# Altium footprint library IDETEC.PcbLib: 275 footprints (part 13 of 18)
Each footprint in its own frame and in the unit in brackets; x right, y up, seen from the top. Pads: shape width x height; smd on the part's side, far side on the other; paste and mask are expansions set on the pad; w line width, h text height; cw(c..) or ccw(c..) is an arc to the next point about the centre after c.
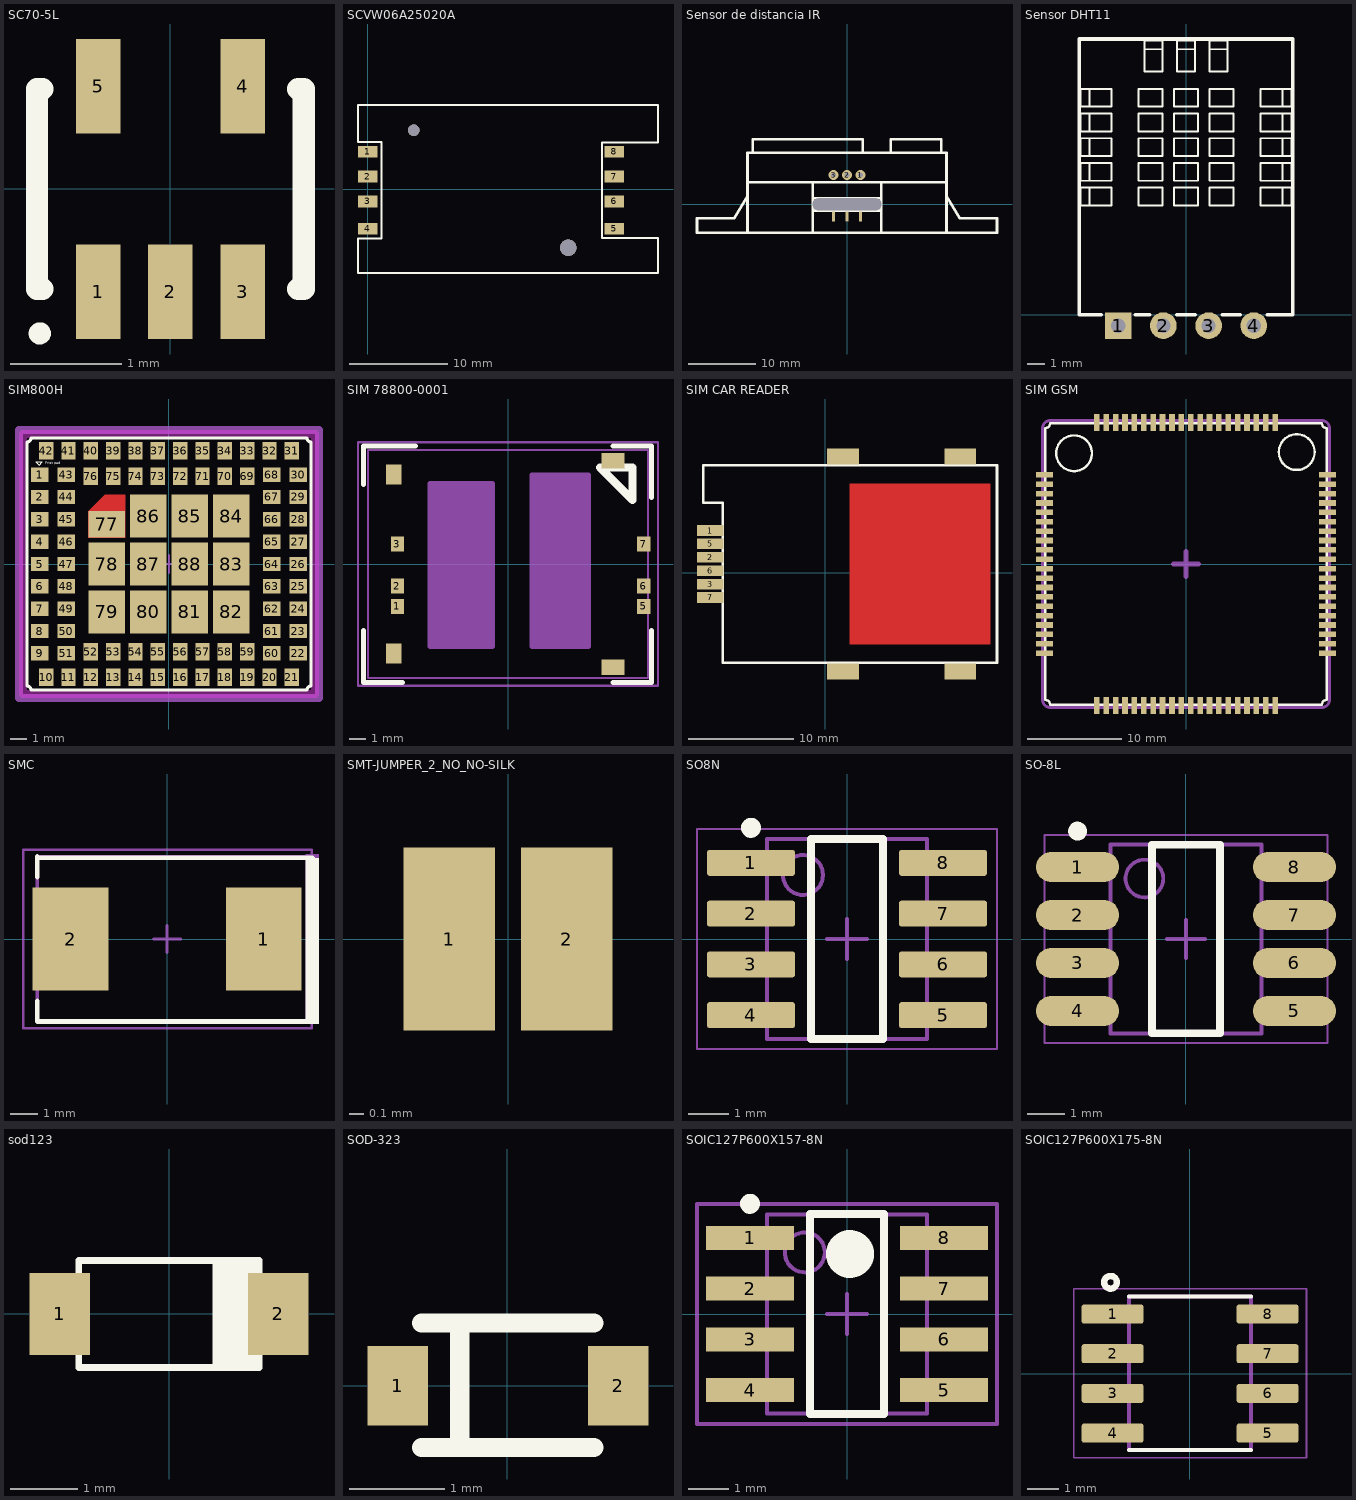
[diagram p12: the footprints below, top view; thin cyan lines are the x and y axes]

## SC70-5L [mm] "SOT-23/SC-74A; 5 Leads; Body 3.1 x 3.1 mm, inc. leads (LxW max)"
height 1.45
pads (5):
  rect 0.4x0.85 smd: 1(-0.65,-0.925) 2(0,-0.925) 3(0.65,-0.925) 4(0.65,0.923) 5(-0.65,0.925)
Top Overlay:
  circle w0.1: c-1.175,-1.3 r0.05
  lines w0.2: -1.15,-0.9 -1.2,-0.9 -1.2,0.9 -1.15,0.9 ; 1.15,-0.9 1.2,-0.9 1.2,0.9 1.15,0.9
3D body "User Library-SC70-5-1.STEP": height 0.95, standoff 0, extent -1,-1.05 1,1.05

## SCVW06A25020A [mm] "SIM CARD BLOCK TYPE, HINGED COVER"
height 2.5
pads (8):
  rect 2x1.2 smd: 1(0,3.81) 2(0,1.27) 3(0,-1.27) 4(0,-4.064) 5(25.22,-4.064) 6(25.22,-1.27) 7(25.22,1.27) 8(25.22,3.81)
via 20.51,-6 diameter 1.7 hole 1.7
via 4.71,6 diameter 1.2 hole 1.2
Top Overlay:
  lines w0.2: -0.99,-8.6 -0.21,-8.6 29.7,-8.6 29.7,-5.025 23.95,-5.025 23.95,-0.95 23.95,1.41 23.95,4.76 29.7,4.76 29.7,8.6 -0.99,8.6 -0.99,4.79 1.418,4.79 1.418,2.003 1.418,-2.228 1.418,-5.075 -0.99,-5.075 -0.99,-5.851 -0.99,-7.82 -0.99,-8.6
3D body "SIMLOCK-1.STEP": height 2.5, standoff 0, extent -0.66,-8.73 29.34,8.57

## Sensor de distancia IR [mm] "sensor de distancia"
height 12
pads (7):
  round 1.5 hole 0.8: 1(2,4.35) 2(0,4.35) 3(-2,4.35)
  rect 0.5x1.5 smd: ""(-2,-1.78) ""(0,-1.78) ""(2,-1.78)
  round 0 hole 1.8 slot 10.2 at 0 deg unplated: ""(0,0)
Top Overlay:
  lines w0.4: -14.75,3.3 14.75,3.3 ; -14.75,5 -14.75,7.665 ; -13.975,7.665 -13.975,9.66 2.325,9.66 2.325,7.66 ; -5.1,-4.2 -5.1,-0.9 ; -5.1,3.3 -5.1,0.9 ; 5.1,-4.2 5.1,-0.9 ; 5.1,3.3 5.1,0.9 ; 6.475,7.66 6.475,9.66 13.975,9.66 13.975,7.665 ; -14.75,-4.2 14.75,-4.2 ; -14.75,-4.2 -14.75,7.665 ; -14.75,-4.2 -18.5,-4.2 -22.25,-4.2 -22.25,-2.05 -16.75,-2.05 -14.75,1.3 -14.75,-4.2 ; -14.75,7.665 14.75,7.665 14.75,-4.2 ; -5.1,-0.9 5.1,-0.9 ; -5.1,-0.9 -5.1,0.9 ; -5.1,0.9 5.1,0.9 ; 5.1,-0.9 5.1,0.9 ; 14.75,-4.2 18.5,-4.2 22.25,-4.2 22.25,-2.05 16.75,-2.05 14.75,1.3 14.75,-4.2
3D body "User Library-sharp.STEP": height 13.04, standoff -5.96, extent -22.24,-4.17 22.26,9.73

## Sensor DHT11 [mm] "sensor de humeada y temperarura"
height 12
pads (4):
  rect 1.5x1.5 hole 0.8: 1(-3.81,-0.6)
  round 1.5 hole 0.8: 2(-1.27,-0.6) 3(1.27,-0.6) 4(3.81,-0.6)
Top Overlay:
  lines w0.11: -5.425,6.15 -5.425,7.15 ; -5.425,7.537 -5.425,8.537 ; -5.425,8.935 -5.425,9.925 ; -5.425,10.312 -5.425,11.31 ; -5.425,11.7 -5.425,12.7 -5.925,12.7 ; -2.331,14.925 -1.331,14.925 ; -0.5,13.675 -0.5,15.425 0.5,15.425 ; -0.5,14.925 0.506,14.925 ; -0.494,13.675 0.506,13.675 0.506,15.425 ; 1.341,14.925 2.331,14.925 2.331,15.425 ; 5.425,6.15 5.425,7.15 ; 5.425,7.537 5.425,8.537 ; 5.425,8.935 5.425,9.925 ; 5.425,10.312 5.425,11.31 ; 5.425,11.7 5.425,12.7 5.925,12.7 ; -5.925,12.7 -4.175,12.7 -4.175,11.7 -5.925,11.7 -5.925,12.7 ; 2.331,15.425 1.331,15.425 1.331,13.675 2.331,13.675 2.331,15.425 ; 5.925,12.7 5.925,11.7 4.175,11.7 4.175,12.7 5.925,12.7 ; -5.925,6.15 -5.925,7.15 -4.175,7.15 -4.175,6.15 -5.925,6.15 ; -5.925,7.537 -5.925,8.537 -4.175,8.537 -4.175,7.537 -5.925,7.537 ; -5.925,8.925 -5.925,9.925 -5.487,9.925 -4.613,9.925 -4.175,9.925 -4.175,8.925 -5.925,8.925 ; -5.925,10.312 -5.925,11.312 -4.175,11.312 -4.175,10.312 -5.925,10.312 ; -2.68,6.15 -2.68,7.15 -1.33,7.15 -1.33,6.15 -2.68,6.15 ; -2.68,7.537 -2.68,8.537 -1.33,8.537 -1.33,7.537 -2.68,7.537 ; -2.68,8.925 -2.68,9.925 -1.33,9.925 -1.33,8.925 -2.68,8.925 ; -2.68,10.312 -2.68,11.312 -1.33,11.312 -1.33,10.312 -2.68,10.312 ; -2.68,11.7 -1.33,11.7 -1.33,12.7 -2.68,12.7 -2.68,11.7 ; -2.331,13.675 -2.331,15.425 -1.331,15.425 -1.331,13.675 -2.331,13.675 ; -0.675,6.15 -0.675,7.15 0.675,7.15 0.675,6.15 -0.675,6.15 ; -0.675,7.537 -0.675,8.537 0.675,8.537 0.675,7.537 -0.675,7.537 ; -0.675,8.925 -0.675,9.925 0.675,9.925 0.675,8.925 -0.675,8.925 ; -0.675,10.312 -0.675,11.312 0.675,11.312 0.675,10.312 -0.675,10.312 ; -0.675,11.7 0.675,11.7 0.675,12.7 -0.675,12.7 -0.675,11.7 ; 1.33,6.15 2.68,6.15 2.68,7.15 1.33,7.15 1.33,6.15 ; 1.33,7.537 2.68,7.537 2.68,8.537 1.33,8.537 1.33,7.537 ; 1.33,8.925 2.68,8.925 2.68,9.925 1.33,9.925 1.33,8.925 ; 1.33,10.312 2.68,10.312 2.68,11.312 1.33,11.312 1.33,10.312 ; 1.33,11.7 1.33,12.7 2.68,12.7 2.68,11.7 1.33,11.7 ; 4.175,6.15 5.925,6.15 5.925,7.15 4.175,7.15 4.175,6.15 ; 4.175,7.537 5.925,7.537 5.925,8.537 4.175,8.537 4.175,7.537 ; 4.175,8.925 5.925,8.925 5.925,9.925 4.175,9.925 4.175,8.925 ; 4.175,10.312 5.925,10.312 5.925,11.312 4.175,11.312 4.175,10.312
  lines w0.2: -4.77,0 -6,0 -6,15.5 0,15.5 6,15.5 6,0 4.57,0 ; -2.84,0 -2.03,0 ; -0.51,0 0.51,0 ; 2.05,0 3.04,0
3D body "DHT11.STEP": height 5.5, standoff -1.58, extent -6,-0.625 6,15.375

## SIM800H [mm] "Module GSM/GPRS quad-band 88pns LGA"
height 2.4
pads (88):
  rect 1.1x0.9 smd: 1(-8.1,5.6) 2(-8.1,4.2) 3(-8.1,2.8) 4(-8.1,1.4) 5(-8.1,0) 6(-8.1,-1.4) 7(-8.1,-2.8) 8(-8.1,-4.2) 9(-8.1,-5.6) 22(8.1,-5.6) 23(8.1,-4.2) 24(8.1,-2.8) 25(8.1,-1.4) 26(8.1,0) 27(8.1,1.4) 28(8.1,2.8) 29(8.1,4.2) 30(8.1,5.6) 43(-6.45,5.6) 44(-6.45,4.2) 45(-6.45,2.8) 46(-6.45,1.4) 47(-6.45,0) 48(-6.45,-1.4) 49(-6.45,-2.8) 50(-6.45,-4.2) 51(-6.45,-5.6) 60(6.45,-5.6) 61(6.45,-4.2) 62(6.45,-2.8) 63(6.45,-1.4) 64(6.45,0) 65(6.45,1.4) 66(6.45,2.8) 67(6.45,4.2) 68(6.45,5.6)
  rect 0.9x1.1 smd: 10(-7.7,-7.1) 11(-6.3,-7.1) 12(-4.9,-7.1) 13(-3.5,-7.1) 14(-2.1,-7.1) 15(-0.7,-7.1) 16(0.7,-7.1) 17(2.1,-7.1) 18(3.5,-7.1) 19(4.9,-7.1) 20(6.3,-7.1) 21(7.7,-7.1) 31(7.7,7.1) 32(6.3,7.1) 33(4.9,7.1) 34(3.5,7.1) 35(2.1,7.1) 36(0.7,7.1) 37(-0.7,7.1) 38(-2.1,7.1) 39(-3.5,7.1) 40(-4.9,7.1) 41(-6.3,7.1) 42(-7.7,7.1) 52(-4.9,-5.5) 53(-3.5,-5.5) 54(-2.1,-5.5) 55(-0.7,-5.5) 56(0.7,-5.5) 57(2.1,-5.5) 58(3.5,-5.5) 59(4.9,-5.5) 69(4.9,5.5) 70(3.5,5.5) 71(2.1,5.5) 72(0.7,5.5) 73(-0.7,5.5) 74(-2.1,5.5) 75(-3.5,5.5) 76(-4.9,5.5)
  rrect5% 2.3x1.67 smd: 77(-3.899,2.497)
  rect 2.3x2.7 smd: 78(-3.9,0) 79(-3.9,-3) 80(-1.3,-3) 81(1.3,-3) 82(3.9,-3) 83(3.9,0) 84(3.9,3) 85(1.3,3) 86(-1.3,3) 87(-1.3,0) 88(1.3,0)
Top Layer:
  region: -5.05,1.65 -5.05,3.32 -4.02,4.35 -2.75,4.35 -2.75,1.65
Top Overlay:
  lines w0.05: -8.34,6.4 -8.14,6.2 -7.94,6.4 -8.34,6.4
  lines w0.2: -8.9,-7.65 cw(c-8.9,-7.9) -8.65,-7.9 8.65,-7.9 cw(c8.9,-7.9) 8.9,-7.65 8.9,7.65 cw(c8.9,7.9) 8.65,7.9 -8.65,7.9 cw(c-8.9,7.9) -8.9,7.65 -8.9,-7.65
  text "Frist pad" at -7.77,6.25 h0.15
Keep-Out Layer:
  lines w0.5: -9.15,-8.15 -9.15,8.15 9.15,8.15 9.15,-8.15 -9.15,-8.15
Mechanical 15:
  lines w0.1: -0.566,0 0.565,0 ; 0,-0.566 0,0.565
  lines w0.5: -9.4,-8.4 9.4,-8.4 9.4,8.4 -9.4,8.4 -9.4,-8.4
3D body "User Library-SIM800H.STEP": height 2.58, standoff 0.16, extent -8.9,-7.9 8.9,7.9

## SIM 78800-0001 [mm] "micro-SIM Card Socket without Detect Switch, Surface  Mount, 6 Circuits, Halogen-Free, Lead-Free"
height 1.7
pads (10):
  rect 0.8x0.9 smd: 1(-6.71,-2.575) 2(-6.71,-1.335) 3(-6.71,1.205) 5(8.23,-2.575) 6(8.23,-1.335) 7(8.23,1.205)
  rect 0.95x1.2 smd: ""(-6.94,-5.425) ""(-6.94,5.425)
  rect 1.4x0.95 smd: ""(6.37,-6.265) ""(6.37,6.255)
Top Overlay:
  lines w0.3: -8.753,-4.044 -8.753,-7.181 -6.407,-7.181 ; -8.753,4.825 -8.753,7.171 -5.616,7.171 ; 6.37,-7.181 8.716,-7.181 8.716,-4.044 ; 6.37,7.171 8.716,7.171 8.716,4.034
  lines w0.5: 5.581,5.852 7.548,3.885 7.548,5.852 5.581,5.852
Mechanical 1:
  rectangle: 1.44,-5.001 4.881,5.413
  rectangle: -4.723,-5.001 -0.947,4.896
  lines w0.3: -4.723,-5.001 -0.947,-5.001 -0.947,4.896 -4.723,4.896 -4.723,-5.001 ; 1.44,-5.001 1.44,5.413 4.881,5.413 4.881,-5.001 1.44,-5.001
Mechanical 13:
  lines w0.12: -8.48,-6.925 8.48,-6.925 8.48,6.925 -8.48,6.925 -8.48,-6.925
Mechanical 15:
  lines w0.15: -9.1,-7.4 9.1,-7.4 9.1,7.4 -9.1,7.4 -9.1,-7.4
3D body "788000001.STEP": height 1.3, standoff -0.21, extent -8.48,-6.925 8.48,6.925

## SIM CAR READER [mm] "SIM CAR READER 101"
pads (10):
  rect 2.5x1 smd: 1(-10.918,3.986) 2(-10.918,1.446) 3(-10.918,-1.094) 5(-10.918,2.716) 6(-10.918,0.176) 7(-10.918,-2.364)
  rect 3x1.5 smd: ""(1.682,-9.389) ""(1.682,11.011) ""(12.782,-9.389) ""(12.782,11.011)
Top Layer:
  rectangle: 2.312,-6.809 15.647,8.431
Top Overlay:
  lines w0.254: -11.568,6.611 -11.568,10.161 16.282,10.161 16.282,-8.539 -9.738,-8.539 -9.738,6.611 -11.568,6.611
3D body "User Library-SIM_holder.STEP": height 1.95, standoff 0, extent -11.545,-9.254 16.305,10.946

## SIM GSM [mm] "SIM GSM 2"
pads (80):
  rect 1.8x0.6 smd: 1(-15.1,9.5) 2(-15.1,8.5) 3(-15.1,7.5) 4(-15.1,6.5) 5(-15.1,5.5) 6(-15.1,4.5) 7(-15.1,3.5) 8(-15.1,2.5) 9(-15.1,1.5) 10(-15.1,0.5) 11(-15.1,-0.5) 12(-15.1,-1.5) 13(-15.1,-2.5) 14(-15.1,-3.5) 15(-15.1,-4.5) 16(-15.1,-5.5) 17(-15.1,-6.5) 18(-15.1,-7.5) 19(-15.1,-8.5) 20(-15.1,-9.5) 41(15.1,-9.5) 42(15.1,-8.5) 43(15.1,-7.5) 44(15.1,-6.5) 45(15.1,-5.5) 46(15.1,-4.5) 47(15.1,-3.5) 48(15.1,-2.5) 49(15.1,-1.5) 50(15.1,-0.5) 51(15.1,0.5) 52(15.1,1.5) 53(15.1,2.5) 54(15.1,3.5) 55(15.1,4.5) 56(15.1,5.5) 57(15.1,6.5) 58(15.1,7.5) 59(15.1,8.5) 60(15.1,9.5)
  rect 0.6x1.8 smd: 21(-9.5,-15.1) 22(-8.5,-15.1) 23(-7.5,-15.1) 24(-6.5,-15.1) 25(-5.5,-15.1) 26(-4.5,-15.1) 27(-3.5,-15.1) 28(-2.5,-15.1) 29(-1.5,-15.1) 30(-0.5,-15.1) 31(0.5,-15.1) 32(1.5,-15.1) 33(2.5,-15.1) 34(3.5,-15.1) 35(4.5,-15.1) 36(5.5,-15.1) 37(6.5,-15.1) 38(7.5,-15.1) 39(8.5,-15.1) 40(9.5,-15.1) 61(9.5,15.1) 62(8.5,15.1) 63(7.5,15.1) 64(6.5,15.1) 65(5.5,15.1) 66(4.5,15.1) 67(3.5,15.1) 68(2.5,15.1) 69(1.5,15.1) 70(0.5,15.1) 71(-0.5,15.1) 72(-1.5,15.1) 73(-2.5,15.1) 74(-3.5,15.1) 75(-4.5,15.1) 76(-5.5,15.1) 77(-6.5,15.1) 78(-7.5,15.1) 79(-8.5,15.1) 80(-9.5,15.1)
Top Overlay:
  circle w0.254: c-11.938,11.811 r1.905
  circle w0.254: c11.811,11.938 r1.905
  lines w0.254: -15,-14.5 cw(c-15,-15) -14.5,-15 14.5,-15 cw(c15,-15) 15,-14.5 15,14.5 cw(c15,15) 14.5,15 -14.5,15 cw(c-15,15) -15,14.5 -15,-14.5
Mechanical 15:
  lines w0.3: -15.3,-14.5 ccw(c-14.5,-14.5) -14.5,-15.3 14.5,-15.3 ccw(c14.5,-14.5) 15.3,-14.5 15.3,14.5 ccw(c14.5,14.5) 14.5,15.3 -14.5,15.3 ccw(c-14.5,14.5) -15.3,14.5 -15.3,-14.5
  lines w0.5: -1.366,0 1.365,0 ; 0,-1.366 0,1.365
3D body "User Library-SIM908.STEP": height 3.21, standoff 0.01, extent -15,-15 15,15

## SMC [mil] "Molded Diode, 2-Leads, Body 6.9x5.8mm, IPC Medium Density, based on OnSemi component dimensions and land patterns"
height 94.88
pads (2):
  rect 110x150 smd: 1(140.49,0) 2(-140.49,0)
Top Overlay:
  region: 221.04,118.11 201.04,118.11 201.04,-123.5 221.04,-123.5
  lines w7: -189,-90.25 -189,-120 210,-120 ; -189,90.25 -189,120 ; -187.39,118.11 211.61,118.11
Mechanical 5:
  region: 221.04,123.5 201.04,123.5 201.04,-123.5 221.04,-123.5
  lines w5: 210,-120 -189,-120 -189,120 210,120
Mechanical 15:
  lines w3.94: -19.68,0 19.69,0 ; 0,-19.68 0,19.68 ; -209.38,-129.92 -209.38,129.92 210.46,129.92 210.46,-129.92 -209.38,-129.92
3D body "SMC_nominal.stp": height 91.35, standoff 0.6, extent -156.5,-116.15 156.5,116.13

## SMT-JUMPER_2_NO_NO-SILK [mil] "SMT-JUMPER_2_NO_NO-SILK"
pads (2):
  rect 25x50 smd: 1(-16,0) 2(16,0)

## SO8N [mm] "SOIC, 8-Leads, Body 4,90x3,90mm, Pitch 1,27mm, IPC Medium Density"
height 1.65
pads (8):
  rrect20% 2.2x0.65 smd: 1(-2.4,1.905) 2(-2.4,0.635) 3(-2.4,-0.635) 4(-2.4,-1.905) 5(2.4,-1.905) 6(2.4,-0.635) 7(2.4,0.635) 8(2.4,1.905)
Top Overlay:
  circle w0.25: c-2.4,2.78 r0.125
  lines w0.2: -0.9,-2.5 0.9,-2.5 0.9,2.5 -0.9,2.5 -0.9,-2.5
Mechanical 13:
  circle w0.1: c-1.1,1.6 r0.5
  lines w0.1: -2,-2.5 2,-2.5 2,2.5 -2,2.5 -2,-2.5
Mechanical 15:
  lines w0.05: -3.75,-2.75 3.75,-2.75 3.75,2.75 -3.75,2.75 -3.75,-2.75
  lines w0.1: -0.5,0 0.5,0 ; 0,-0.5 0,0.5
3D body "User Library-SOIC127P500X620X175-8.STEP": height 1.75, standoff 0, extent -3.114,-2.5 3.115,2.5

## SO-8L [mm] "SOIC, 8-Leads, Body 4,90x3,90mm, Pitch 1,27mm, IPC Medium Density"
height 1.65
pads (8):
  oval 2.2x0.8 smd: 1(-2.87,1.905) 2(-2.87,0.635) 3(-2.87,-0.635) 4(-2.87,-1.905) 5(2.87,-1.905) 6(2.87,-0.635) 7(2.87,0.635) 8(2.87,1.905)
Top Overlay:
  circle w0.25: c-2.87,2.855 r0.125
  lines w0.2: -0.9,-2.5 -0.9,2.5 0.9,2.5 0.9,-2.5 -0.9,-2.5
Mechanical 13:
  circle w0.1: c-1.1,1.6 r0.5
  lines w0.1: -2,-2.5 -2,2.5 2,2.5 2,-2.5 -2,-2.5
Mechanical 15:
  lines w0.05: -3.75,-2.75 -3.75,2.75 3.75,2.75 3.75,-2.75 -3.75,-2.75
  lines w0.1: -0.5,0 0.5,0 ; 0,-0.5 0,0.5
3D body "SW3dPS-so-8.STEP": height 1.88, standoff -0.03, extent -3.159,-2.514 3.179,2.49

## sod123 [mm] "SOD123"
pads (2):
  rect 0.91x1.22 smd: 1(-1.635,0) 2(1.635,0)
Top Overlay:
  region: 1.349,0.8 0.649,0.8 0.649,-0.8 1.349,-0.8
  lines w0.1: -1.35,-0.8 1.35,-0.8 1.35,0.8 -1.35,0.8 -1.35,-0.8
3D body "User Library-SOD-123_DiodesInc.STEP": height 1.42, standoff -0.03, extent -1.925,-0.85 1.925,0.85

## SOD-323 [mil] "SOD-323"
pads (2):
  rect 25x33 smd: 1(-45.28,0) 2(46,0)
Top Overlay:
  lines w8: -35.43,-25.59 -19.68,-25.59 ; -35.43,26 -19.68,26 ; 36,-25.59 -19.68,-25.59 ; 36,26 -19.68,26 ; -19.68,-25.59 -19.68,26
3D body "User Library-SOD2513X11.STEP": height 43.31, standoff 0, extent -53.14,-24.6 53.16,24.61

## SOIC127P600X157-8N [mm] "SOIC, 8-Leads, Body 5,0x4,0mm (max), Pitch 1,27mm, IPC Medium Density"
height 1.57
pads (8):
  rect 2.2x0.6 smd: 1(-2.425,1.905) 2(-2.425,0.635) 3(-2.425,-0.635) 4(-2.425,-1.905) 5(2.425,-1.905) 6(2.425,-0.635) 7(2.425,0.635) 8(2.425,1.905)
Top Overlay:
  circle w0.6: c0.075,1.5 r0.3
  circle w0.25: c-2.425,2.755 r0.125
  lines w0.2: -0.925,-2.5 0.925,-2.5 0.925,2.5 -0.925,2.5 -0.925,-2.5
Mechanical 13:
  circle w0.1: c-1.055,1.54 r0.5
  lines w0.1: -2.005,-2.49 2.005,-2.49 2.005,2.49 -2.005,2.49 -2.005,-2.49
Mechanical 15:
  lines w0.1: -0.5,0 0.5,0 ; 0,-0.5 0,0.5 ; -3.75,-2.75 3.75,-2.75 3.75,2.75 -3.75,2.75 -3.75,-2.75
3D body "SOIC_SO8 NARROW.STEP": height 1.7, standoff 0, extent -3.074,-2.4 3.124,2.426

## SOIC127P600X175-8N [mil]
pads (8):
  rrect25% 78x24 smd: 1(-97.44,75) 2(-97.44,25) 3(-97.44,-25) 4(-97.44,-75) 5(98,-75) 6(98,-25) 7(98,25) 8(98,75)
Top Overlay:
  circle w8: c-100,115 r8
  lines w5: -76.77,-96.46 77,-96.46 ; -76.77,97 77,97
Mechanical 16:
  lines w5: -76.77,-96.46 -76.77,97 77,97 77,-96.46 -76.77,-96.46
Mechanical 27:
  lines w2: -146.06,-106.3 -146.06,107 147,107 147,-106.3 -146.06,-106.3
3D body "User Library-SOIC127P610X343-8N.STEP": height 136.93, standoff 0, extent -118.1,-114.97 118.12,114.95